# Altium footprint library 3.22-杂项.PcbLib: 985 footprints (part 3 of 64)
Each footprint in its own frame and in the unit in brackets; x right, y up, seen from the top. Pads: shape width x height; smd on the part's side, far side on the other; paste and mask are expansions set on the pad; w line width, h text height; cw(c..) or ccw(c..) is an arc to the next point about the centre after c.
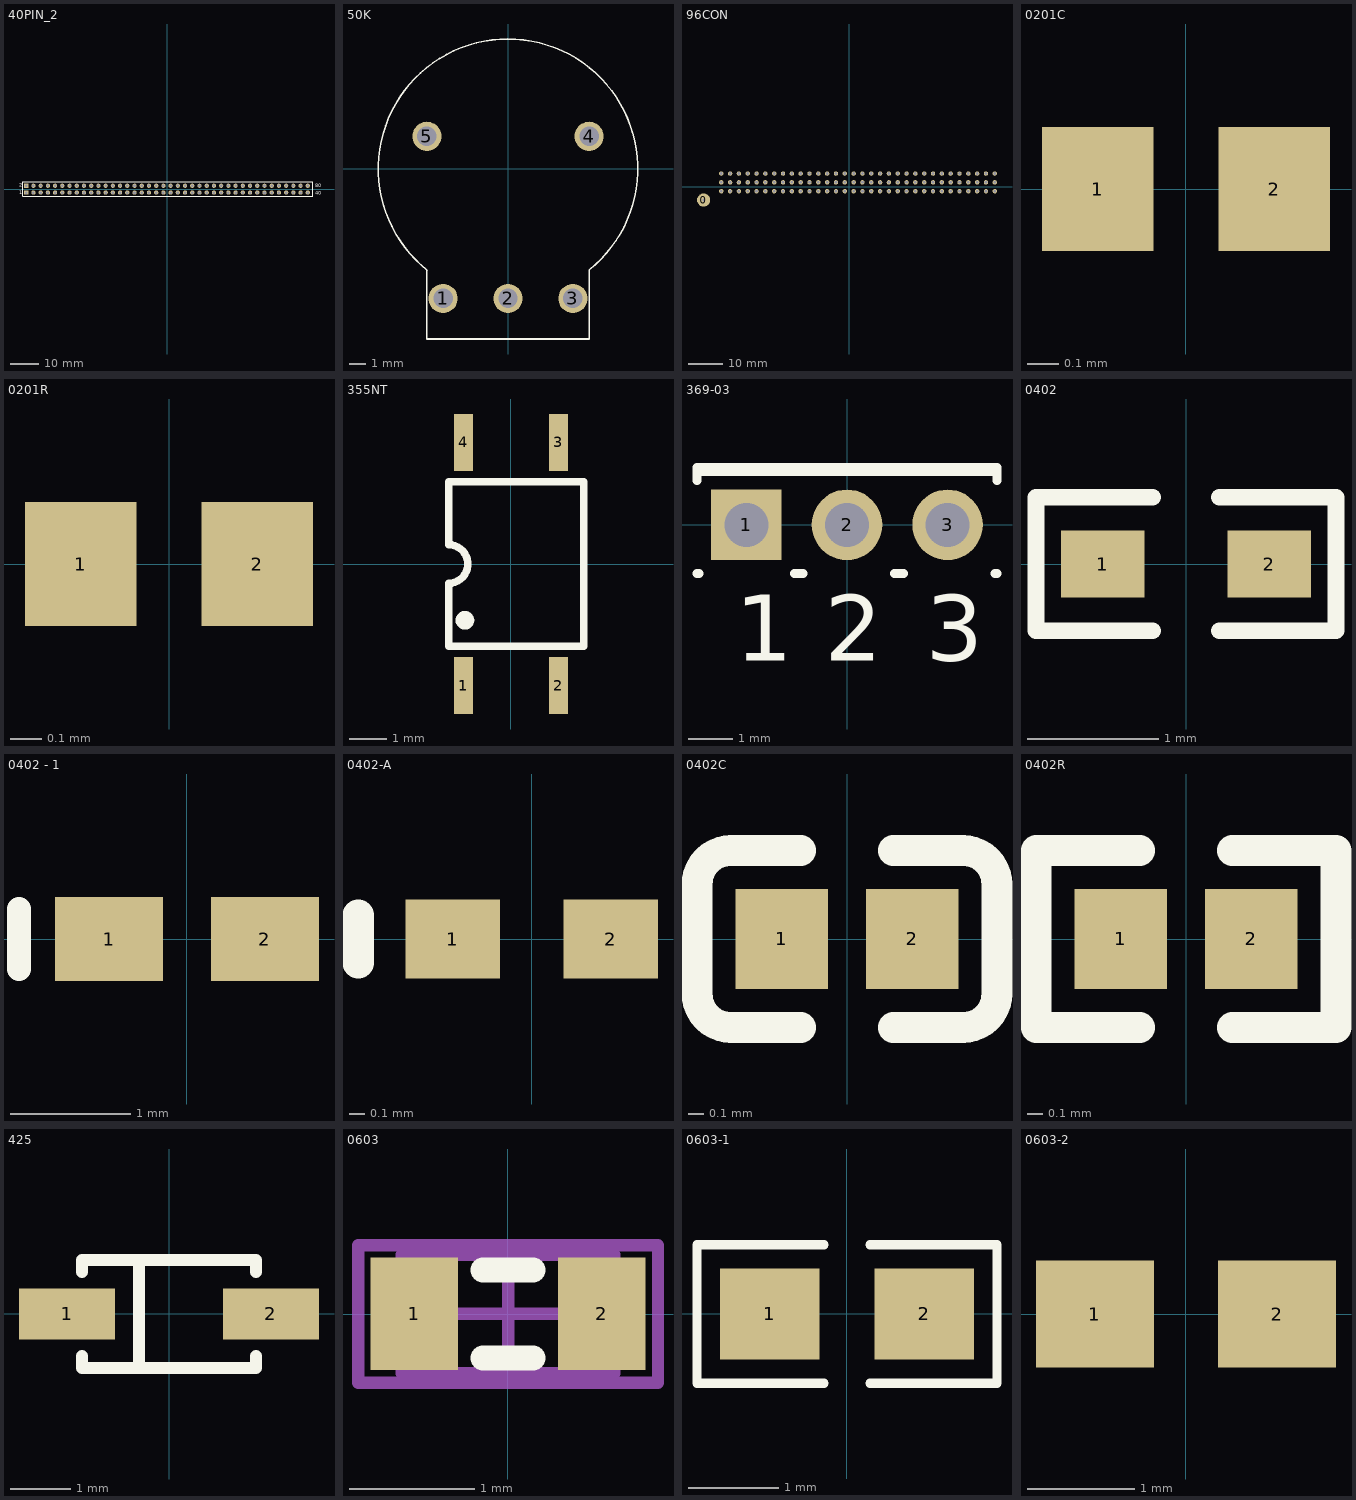
[diagram p2: the footprints below, top view; thin cyan lines are the x and y axes]

## 40PIN_2 [mm]
pads (80):
  rect 1.5x1.5 hole 0.9: 1(-49.53,-1.206) 41(-49.53,1.206)
  round 1.5 hole 0.9: 2(-46.99,-1.206) 3(-44.45,-1.206) 4(-41.91,-1.206) 5(-39.37,-1.206) 6(-36.83,-1.206) 7(-34.29,-1.206) 8(-31.75,-1.206) 9(-29.21,-1.206) 10(-26.67,-1.206) 11(-24.13,-1.206) 12(-21.59,-1.206) 13(-19.05,-1.206) 14(-16.51,-1.206) 15(-13.97,-1.206) 16(-11.43,-1.206) 17(-8.89,-1.206) 18(-6.35,-1.206) 19(-3.81,-1.206) 20(-1.27,-1.206) 21(1.27,-1.206) 22(3.81,-1.206) 23(6.35,-1.206) 24(8.89,-1.206) 25(11.43,-1.206) 26(13.97,-1.206) 27(16.51,-1.206) 28(19.05,-1.206) 29(21.59,-1.206) 30(24.13,-1.206) 31(26.67,-1.206) 32(29.21,-1.206) 33(31.75,-1.206) 34(34.29,-1.206) 35(36.83,-1.206) 36(39.37,-1.206) 37(41.91,-1.206) 38(44.45,-1.206) 39(46.99,-1.206) 40(49.53,-1.206) 42(-46.99,1.206) 43(-44.45,1.206) 44(-41.91,1.206) 45(-39.37,1.206) 46(-36.83,1.206) 47(-34.29,1.206) 48(-31.75,1.206) 49(-29.21,1.206) 50(-26.67,1.206) 51(-24.13,1.206) 52(-21.59,1.206) 53(-19.05,1.206) 54(-16.51,1.206) 55(-13.97,1.206) 56(-11.43,1.206) 57(-8.89,1.206) 58(-6.35,1.206) 59(-3.81,1.206) 60(-1.27,1.206) 61(1.27,1.206) 62(3.81,1.206) 63(6.35,1.206) 64(8.89,1.206) 65(11.43,1.206) 66(13.97,1.206) 67(16.51,1.206) 68(19.05,1.206) 69(21.59,1.206) 70(24.13,1.206) 71(26.67,1.206) 72(29.21,1.206) 73(31.75,1.206) 74(34.29,1.206) 75(36.83,1.206) 76(39.37,1.206) 77(41.91,1.206) 78(44.45,1.206) 79(46.99,1.206) 80(49.53,1.206)
Top Overlay:
  lines w0.2: -50.8,-2.476 51.308,-2.476 51.308,2.603 -50.8,2.603 -50.8,-2.476
  text "40" at 52.07,-1.968 h1.27
  text "80" at 52.197,0.699 h1.27
  text "1" at -52.07,-1.714 h1.27
  text "2" at -52.07,0.826 h1.27

## 50K [mm]
pads (5):
  round 1.8 hole 1.2: 1(-4,-8) 2(0,-8) 3(4,-8) 4(5,2) 5(-5,2)
Top Overlay:
  lines w0.1: -5,-6.261 -5,-10.5 5.004,-10.5 5,-10.5 5,-6.248 5.004,-6.248 ; -4.992,-6.251 cw(c0,0) 5.001,-6.244
3D body: height 2, standoff 0, extent -7.937,-7.984 8,7.984
3D body: height 2, standoff 0, extent -5.004,-10.49 5.029,-1.549

## 96CON [mil]
pads (97):
  round 150 hole 30: 0(-1650,-150)
  round 50 hole 30: 1(1650,150) 2(1550,150) 3(1450,150) 4(1350,150) 5(1250,150) 6(1150,150) 7(1050,150) 8(950,150) 9(850,150) 10(750,150) 11(650,150) 12(550,150) 13(450,150) 14(350,150) 15(250,150) 16(150,150) 17(50,150) 18(-50,150) 19(-150,150) 20(-250,150) 21(-350,150) 22(-450,150) 23(-550,150) 24(-650,150) 25(-750,150) 26(-850,150) 27(-950,150) 28(-1050,150) 29(-1150,150) 30(-1250,150) 31(-1350,150) 32(-1450,150) 33(1650,50) 34(1550,50) 35(1450,50) 36(1350,50) 37(1250,50) 38(1150,50) 39(1050,50) 40(950,50) 41(850,50) 42(750,50) 43(650,50) 44(550,50) 45(450,50) 46(350,50) 47(250,50) 48(150,50) 49(50,50) 50(-50,50) 51(-150,50) 52(-250,50) 53(-350,50) 54(-450,50) 55(-550,50) 56(-650,50) 57(-750,50) 58(-850,50) 59(-950,50) 60(-1050,50) 61(-1150,50) 62(-1250,50) 63(-1350,50) 64(-1450,50) 65(1650,-50) 66(1550,-50) 67(1450,-50) 68(1350,-50) 69(1250,-50) 70(1150,-50) 71(1050,-50) 72(950,-50) 73(850,-50) 74(750,-50) 75(650,-50) 76(550,-50) 77(450,-50) 78(350,-50) 79(250,-50) 80(150,-50) 81(50,-50) 82(-50,-50) 83(-150,-50) 84(-250,-50) 85(-350,-50) 86(-450,-50) 87(-550,-50) 88(-650,-50) 89(-750,-50) 90(-850,-50) 91(-950,-50) 92(-1050,-50) 93(-1150,-50) 94(-1250,-50) 95(-1350,-50) 96(-1450,-50)

## 0201C [mm] "贴片无丝印"
pads (2):
  rect 0.36x0.4 smd mask+0.051: 1(-0.285,0) 2(0.285,0)
3D body: height 0.31, standoff 0, extent -0.305,-0.152 0.305,0.153

## 0201R [mm] "贴片无丝印"
pads (2):
  rect 0.36x0.4 smd mask+0.051: 1(-0.285,0) 2(0.285,0)
3D body: height 0.34, standoff 0, extent -0.34,-0.165 0.34,0.165

## 355NT [mil] "高可靠性光耦355NT(COSMO)"
height 47.24
pads (4):
  rect 20x60 smd: 1(-50,-127.95) 2(50,-127.95) 3(50,127.95) 4(-50,127.95)
Top Overlay:
  circle w9.84: c-48.31,-59.25 r4.92
  lines w7.87: -65.51,-86.61 -65.51,-20.34 ccw(c-65.51,0) -65.51,20.34 -65.51,86.61 76.73,86.61 76.73,-86.61 -65.51,-86.61

## 369-03 [mm] "TO, Thru-Hole, Vertical, Heatsink Mounted; 3 In-Line Leads; Pitch 2.28 mm"
height 9.7
pads (3):
  rect 1.6x1.6 hole 1: 1(-2.28,0)
  round 1.6 hole 1: 2(0,0) 3(2.28,0)
Top Overlay:
  lines w0.2: -3.4,-1.1 -3.35,-1.1 ; -3.4,1 -3.4,1.3 3.4,1.3 3.4,1 ; -3.4,1.21 3.4,1.21 ; -1.19,-1.1 -0.99,-1.1 ; 1.08,-1.1 1.28,-1.1 ; 3.35,-1.1 3.4,-1.1
  text "3" at 1.78,-3.075 h1.5
  text "2" at -0.5,-3.075 h1.5
  text "1" at -2.53,-3.075 h1.5

## 0402 [mil]
pads (2):
  rect 25x20 smd: 1(-25,0) 2(25,0)
Top Overlay:
  lines w5: -10,-20 -45,-20 -45,20 -10,20 ; 10,-20 45,-20 45,20 10,20
3D body: height 11.85, standoff -0.09, extent -21.68,-9.84 17.7,9.85

## 0402 - 1 [mm] "Chip Capacitor; Body 1.0 x 0.5 mm (LxW typ)"
height 1.35
pads (2):
  rect 0.9x0.7 smd: 1(-0.65,0) 2(0.65,0)
Top Overlay:
  lines w0.2: -1.4,-0.25 -1.4,0.25
3D body: height 0.3, standoff 0, extent -0.525,-0.25 0.475,0.25

## 0402-A [mm] "Chip Inductor; Body 1 x 0.5 mm (LxW typ)"
height 0.55
pads (2):
  rect 0.6x0.5 smd: 1(-0.5,0) 2(0.5,0)
Top Overlay:
  lines w0.2: -1.1,-0.15 -1.1,0.15
3D body: height 0.3, standoff 0, extent -0.5,-0.254 0.5,0.246

## 0402C [mm]
pads (2):
  rect 0.6x0.65 smd mask+0.051: 1(-0.425,0) 2(0.425,0)
Top Overlay:
  lines w0.2: -0.755,-0.575 cw(c-0.755,-0.355) -0.975,-0.355 -0.975,0.355 cw(c-0.755,0.355) -0.755,0.575 ; -0.75,-0.575 -0.3,-0.575 ; -0.75,0.575 -0.3,0.575 ; 0.3,-0.575 0.75,-0.575 ; 0.3,0.575 0.75,0.575 ; 0.755,-0.575 ccw(c0.755,-0.355) 0.975,-0.355 0.975,0.355 ccw(c0.755,0.355) 0.755,0.575
3D body: height 0.2, standoff 0, extent -0.483,-0.3 0.518,0.3

## 0402R [mm]
pads (2):
  rect 0.6x0.65 smd mask+0.051: 1(-0.425,0) 2(0.425,0)
Top Overlay:
  lines w0.2: -0.3,-0.575 -0.975,-0.575 -0.975,0.575 -0.3,0.575 ; 0.3,-0.575 0.975,-0.575 0.975,0.575 0.3,0.575
3D body: height 0.3, standoff 0, extent -0.5,-0.25 0.5,0.25

## 425 [mm] "SOD-123; 2 Leads; Body 2.7 x 1.6 mm, (LxW)"
height 1.35
pads (2):
  rect 1.6x0.85 smd: 1(-1.7,0) 2(1.7,0)
Top Overlay:
  lines w0.2: -1.45,-0.7 -1.45,-0.9 1.45,-0.9 1.45,-0.7 ; -1.45,0.7 -1.45,0.9 1.45,0.9 1.45,0.7 ; -0.5,-0.9 -0.5,0.9

## 0603 [mm]
pads (2):
  rect 0.7x0.9 smd: 1(-0.75,0) 2(0.75,0)
Top Overlay:
  lines w0.2: -0.2,-0.35 0.2,-0.35 ; -0.2,0.35 0.2,0.35
Mechanical 13:
  lines w0.1: -0.85,-0.475 0.85,-0.475 0.85,0.475 -0.85,0.475 -0.85,-0.475
Mechanical 15:
  lines w0.1: -0.475,0 0.475,0 ; 0,-0.475 0,0.475 ; -1.2,-0.55 1.2,-0.55 1.2,0.55 -1.2,0.55 -1.2,-0.55
3D body: height 0.4, standoff 0, extent -0.825,-0.4 0.775,0.4

## 0603-1 [mm] "贴片带丝印"
height 0.6
pads (2):
  rect 1.1x1 smd: 1(-0.85,0) 2(0.85,0)
Top Overlay:
  lines w0.1: -0.254,-0.762 -1.651,-0.762 -1.651,0.762 -0.254,0.762 ; 0.254,-0.762 1.651,-0.762 1.651,0.762 0.254,0.762
3D body: height 0.4, standoff 0, extent -0.775,-0.381 0.825,0.419

## 0603-2 [mm] "贴片无丝印"
height 0.6
pads (2):
  rect 1.1x1 smd: 1(-0.85,0) 2(0.85,0)
3D body: height 0.4, standoff 0, extent -0.8,-0.374 0.8,0.426